# Altium schematic symbol library Analog Devices Data Converters Digital-to-Analog Converters.SchLib: 2231 symbols (part 108 of 135) (continued)
## AD8582AN
designator U?
Dual 12-Bit Digital-to-Analog Converter with Parallel Interface, 5 V, -40 to +85 degC, N-24-1, Tube; Generic Part Number: AD8582; Manufacturer: Analog Devices; PartNumber: AD8582AN; # DAC Outputs: 2; Max V+: 5.25V; Op Pwr Diss: 35mW; Resolution (Bits): 12; Settling Time: 16µs; Single Supply: Yes; DatasheetVersion: Rev.0; PackageVersion: 071006-A; PackageReference: N-24-1; PackageDescription: 24-Lead Plastic Dual In-Line Package [PDIP] Narrow Body; Supplier 1: Digi-Key; Supplier Part Number 1: AD8582AN-ND; Supplier 2: Mouser; Supplier Part Number 2: 584-AD8582AN; Packing: Tube; RoHS: N; Mounting Technology: Through Hole; Code_JEDEC: MS-001; ComponentLink1Description: Manufacturer URL; ComponentLink1URL: http://www.analog.com/en/index.html; ComponentLink2Description: Datasheet; ComponentLink2URL: http://www.analog.com/static/imported-files/data_sheets/AD8582.pdf; ComponentLink3Description: Package Specification; ComponentLink3URL: http://www.analog.com/static/imported-files/packages/50726455539629N_24_1.pdf; ComponentLink4Description: Product URL; ComponentLink4URL: http://www.analog.com/en/digital-to-analog-converters/da-converters/ad8582/products/product.html
footprint N-24-1 (DIP, 24-Leads, Row Spacing 7.62mm, Pitch 2.54mm, Body 31.9x6.6mm)
pins: 1 VOUTA (out) "Voltage outputs from the DACs. Fixed output voltage range of 0 V to 4.095 V with 1 mV/LSB. An internal temperature stabilized reference maintains a fixed full-scale voltage independent of time, temperature and power supply (See Datasheet)", 2 AGND (power) "Analog Ground. Ground reference for the internal bandgap reference voltage, the DAC, and the output buffer.", 3 DGND (power) "Digital ground for input logic.", 4 ~{LDA} (in) "Load DAC register strobes. Transfers input register data to the DAC registers. Active low inputs, Level sensitive latch. May be connected together to doublebuffer load DAC registers.", 5 MSB (in) "Digital Input: High presets DAC registers to half scale (800H), Low clears DAC registers to zero (000H) upon R\S\T\ assertion.", 6 ~{RST} (in) "Active low digital input that clears the DAC register to zero, setting the DAC to minimum scale when MSB pin = 0, or half-scale when MSB pin = 1.", 7 DB0 (in) "Binary Data Bit Input. DB0 is the LSB.", 8 DB1 (in) "Binary Data Bit Input.", 9 DB2 (in) "Binary Data Bit Input.", 10 DB3 (in) "Binary Data Bit Input.", 11 DB4 (in) "Binary Data Bit Input.", 12 DB5 (in) "Binary Data Bit Input.", 13 DB6 (in) "Binary Data Bit Input.", 14 DB7 (in) "Binary Data Bit Input.", 15 DB8 (in) "Binary Data Bit Input.", 16 DB9 (in) "Binary Data Bit Input.", 17 DB10 (in) "Binary Data Bit Input.", 18 DB11 (in) "Binary Data Bit Input.DB11 is the MSB .", 19 ~{CS} (in) "Chip Select. Active low input.", 20 ~{A}/B (in) "Select DAC A = 0 or DAC B = 1.", 21 ~{LDB} (in) "Load DAC register strobes. Transfers input register data to the DAC registers. Active low inputs, Level sensitive latch. May be connected together to doublebuffer load DAC registers.", 22 VDD (power) "Positive Supply. Nominal value +5 V, +/-5%.", 23 VREF (out) "Nominal 2.5 V reference output voltage. This node must be buffered if required to drive external loads.", 24 VOUTB (out) "Voltage outputs from the DACs. Fixed output voltage range of 0 V to 4.095 V with 1 mV/LSB. An internal temperature stabilized reference maintains a fixed full-scale voltage independent of time, temperature and power supply (See Datasheet)"

## AD8582ANZ
designator U?
Dual 12-Bit Digital-to-Analog Converter with Parallel Interface, 5 V, -40 to +85 degC, N-24-1, Pb-Free, Tube; Generic Part Number: AD8582; Manufacturer: Analog Devices; PartNumber: AD8582ANZ; # DAC Outputs: 2; Max V+: 5.25V; Op Pwr Diss: 35mW; Resolution (Bits): 12; Settling Time: 16µs; Single Supply: Yes; DatasheetVersion: Rev.0; PackageVersion: 071006-A; PackageReference: N-24-1; PackageDescription: 24-Lead Plastic Dual In-Line Package [PDIP] Narrow Body; Supplier 1: Digi-Key; Supplier Part Number 1: AD8582ANZ-ND; Supplier 2: Newark; Supplier Part Number 2: 12M9119; Supplier 3: Mouser; Supplier Part Number 3: 584-AD8582ANZ; Packing: Tube; RoHS: Y; Mounting Technology: Through Hole; Code_JEDEC: MS-001; ComponentLink1Description: Manufacturer URL; ComponentLink1URL: http://www.analog.com/en/index.html; ComponentLink2Description: Datasheet; ComponentLink2URL: http://www.analog.com/static/imported-files/data_sheets/AD8582.pdf; ComponentLink3Description: Package Specification; ComponentLink3URL: http://www.analog.com/static/imported-files/packages/50726455539629N_24_1.pdf; ComponentLink4Description: Product URL; ComponentLink4URL: http://www.analog.com/en/digital-to-analog-converters/da-converters/ad8582/products/product.html
footprint N-24-1 (DIP, 24-Leads, Row Spacing 7.62mm, Pitch 2.54mm, Body 31.9x6.6mm)
pins: 1 VOUTA (out) "Voltage outputs from the DACs. Fixed output voltage range of 0 V to 4.095 V with 1 mV/LSB. An internal temperature stabilized reference maintains a fixed full-scale voltage independent of time, temperature and power supply (See Datasheet)", 2 AGND (power) "Analog Ground. Ground reference for the internal bandgap reference voltage, the DAC, and the output buffer.", 3 DGND (power) "Digital ground for input logic.", 4 ~{LDA} (in) "Load DAC register strobes. Transfers input register data to the DAC registers. Active low inputs, Level sensitive latch. May be connected together to doublebuffer load DAC registers.", 5 MSB (in) "Digital Input: High presets DAC registers to half scale (800H), Low clears DAC registers to zero (000H) upon R\S\T\ assertion.", 6 ~{RST} (in) "Active low digital input that clears the DAC register to zero, setting the DAC to minimum scale when MSB pin = 0, or half-scale when MSB pin = 1.", 7 DB0 (in) "Binary Data Bit Input. DB0 is the LSB.", 8 DB1 (in) "Binary Data Bit Input.", 9 DB2 (in) "Binary Data Bit Input.", 10 DB3 (in) "Binary Data Bit Input.", 11 DB4 (in) "Binary Data Bit Input.", 12 DB5 (in) "Binary Data Bit Input.", 13 DB6 (in) "Binary Data Bit Input.", 14 DB7 (in) "Binary Data Bit Input.", 15 DB8 (in) "Binary Data Bit Input.", 16 DB9 (in) "Binary Data Bit Input.", 17 DB10 (in) "Binary Data Bit Input.", 18 DB11 (in) "Binary Data Bit Input.DB11 is the MSB .", 19 ~{CS} (in) "Chip Select. Active low input.", 20 ~{A}/B (in) "Select DAC A = 0 or DAC B = 1.", 21 ~{LDB} (in) "Load DAC register strobes. Transfers input register data to the DAC registers. Active low inputs, Level sensitive latch. May be connected together to doublebuffer load DAC registers.", 22 VDD (power) "Positive Supply. Nominal value +5 V, +/-5%.", 23 VREF (out) "Nominal 2.5 V reference output voltage. This node must be buffered if required to drive external loads.", 24 VOUTB (out) "Voltage outputs from the DACs. Fixed output voltage range of 0 V to 4.095 V with 1 mV/LSB. An internal temperature stabilized reference maintains a fixed full-scale voltage independent of time, temperature and power supply (See Datasheet)"

## AD8582AR
designator U?
Dual 12-Bit Digital-to-Analog Converter with Parallel Interface, 5 V, -40 to +85 degC, RW-24, Tube; Generic Part Number: AD8582; Manufacturer: Analog Devices; PartNumber: AD8582AR; # DAC Outputs: 2; Max V+: 5.25V; Op Pwr Diss: 35mW; Resolution (Bits): 12; Settling Time: 16µs; Single Supply: Yes; DatasheetVersion: Rev.0; PackageVersion: 060706-A; PackageReference: RW-24; PackageDescription: 24-Lead Standard Small Outline Package [SOIC_W]; Supplier 1: Digi-Key; Supplier Part Number 1: AD8582AR-ND; Supplier 2: Mouser; Supplier Part Number 2: 584-AD8582AR; Packing: Tube; RoHS: N; Mounting Technology: Surface Mount; Code_JEDEC: MS-013-AD; ComponentLink1Description: Manufacturer URL; ComponentLink1URL: http://www.analog.com/en/index.html; ComponentLink2Description: Datasheet; ComponentLink2URL: http://www.analog.com/static/imported-files/data_sheets/AD8582.pdf; ComponentLink3Description: Package Specification; ComponentLink3URL: http://www.analog.com/static/imported-files/packages/33665150946139RW_24.pdf; ComponentLink4Description: Product URL; ComponentLink4URL: http://www.analog.com/en/digital-to-analog-converters/da-converters/ad8582/products/product.html
footprint RW-24_N (SOIC, 24-Leads, Body 15.4x7.5mm, Pitch 1.27mm, IPC Medium Density)
footprint RW-24_L (SOIC, 24-Leads, Body 15.4x7.5mm, Pitch 1.27mm, IPC High Density)
footprint RW-24_M (SOIC, 24-Leads, Body 15.4x7.5mm, Pitch 1.27mm, IPC Low Density)
pins: 1 VOUTA (out) "Voltage outputs from the DACs. Fixed output voltage range of 0 V to 4.095 V with 1 mV/LSB. An internal temperature stabilized reference maintains a fixed full-scale voltage independent of time, temperature and power supply (See Datasheet)", 2 AGND (power) "Analog Ground. Ground reference for the internal bandgap reference voltage, the DAC, and the output buffer.", 3 DGND (power) "Digital ground for input logic.", 4 ~{LDA} (in) "Load DAC register strobes. Transfers input register data to the DAC registers. Active low inputs, Level sensitive latch. May be connected together to doublebuffer load DAC registers.", 5 MSB (in) "Digital Input: High presets DAC registers to half scale (800H), Low clears DAC registers to zero (000H) upon R\S\T\ assertion.", 6 ~{RST} (in) "Active low digital input that clears the DAC register to zero, setting the DAC to minimum scale when MSB pin = 0, or half-scale when MSB pin = 1.", 7 DB0 (in) "Twelve Binary Data Bit Input.  DB0 is the LSB.", 8 DB1 (in) "Twelve Binary Data Bit Input.", 9 DB2 (in) "Twelve Binary Data Bit Input.", 10 DB3 (in) "Twelve Binary Data Bit Input.", 11 DB4 (in) "Twelve Binary Data Bit Input.", 12 DB5 (in) "Twelve Binary Data Bit Input.", 13 DB6 (in) "Twelve Binary Data Bit Input.", 14 DB7 (in) "Twelve Binary Data Bit Input.", 15 DB8 (in) "Twelve Binary Data Bit Input.", 16 DB9 (in) "Twelve Binary Data Bit Input.", 17 DB10 (in) "Twelve Binary Data Bit Input.", 18 DB11 (in) "Twelve Binary Data Bit Input. DB11 is the MSB.", 19 ~{CS} (in) "Chip Select. Active low input.", 20 ~{A}/B (in) "Select DAC A = 0 or DAC B = 1.", 21 ~{LDB} (in) "Load DAC register strobes. Transfers input register data to the DAC registers. Active low inputs, Level sensitive latch. May be connected together to doublebuffer load DAC registers.", 22 VDD (power) "Positive Supply. Nominal value +5 V, +/-5%.", 23 VREF (out) "Nominal 2.5 V reference output voltage. This node must be buffered if required to drive external loads.", 24 VOUTB (out) "Voltage outputs from the DACs. Fixed output voltage range of 0 V to 4.095 V with 1 mV/LSB. An internal temperature stabilized reference maintains a fixed full-scale voltage independent of time, temperature and power supply (See Datasheet)"

## AD8582AR-REEL
designator U?
Dual 12-Bit Digital-to-Analog Converter with Parallel Interface, 5 V, -40 to +85 degC, RW-24, Reel; Generic Part Number: AD8582; Manufacturer: Analog Devices; PartNumber: AD8582AR-REEL; # DAC Outputs: 2; Max V+: 5.25V; Op Pwr Diss: 35mW; Resolution (Bits): 12; Settling Time: 16µs; Single Supply: Yes; DatasheetVersion: Rev.0; PackageVersion: 060706-A; PackageReference: RW-24; PackageDescription: 24-Lead Standard Small Outline Package [SOIC_W]; Supplier 1: Digi-Key; Supplier Part Number 1: AD8582AR-REEL-ND; Supplier 2: Newark; Supplier Part Number 2: 59K6879; Supplier 3: Mouser; Supplier Part Number 3: 584-AD8582AR-R; Packing: Reel; RoHS: N; Mounting Technology: Surface Mount; Code_JEDEC: MS-013-AD; ComponentLink1Description: Manufacturer URL; ComponentLink1URL: http://www.analog.com/en/index.html; ComponentLink2Description: Datasheet; ComponentLink2URL: http://www.analog.com/static/imported-files/data_sheets/AD8582.pdf; ComponentLink3Description: Package Specification; ComponentLink3URL: http://www.analog.com/static/imported-files/packages/33665150946139RW_24.pdf; ComponentLink4Description: Product URL; ComponentLink4URL: http://www.analog.com/en/digital-to-analog-converters/da-converters/ad8582/products/product.html
footprint RW-24_N (SOIC, 24-Leads, Body 15.4x7.5mm, Pitch 1.27mm, IPC Medium Density)
footprint RW-24_L (SOIC, 24-Leads, Body 15.4x7.5mm, Pitch 1.27mm, IPC High Density)
footprint RW-24_M (SOIC, 24-Leads, Body 15.4x7.5mm, Pitch 1.27mm, IPC Low Density)
pins: 1 VOUTA (out) "Voltage outputs from the DACs. Fixed output voltage range of 0 V to 4.095 V with 1 mV/LSB. An internal temperature stabilized reference maintains a fixed full-scale voltage independent of time, temperature and power supply (See Datasheet)", 2 AGND (power) "Analog Ground. Ground reference for the internal bandgap reference voltage, the DAC, and the output buffer.", 3 DGND (power) "Digital ground for input logic.", 4 ~{LDA} (in) "Load DAC register strobes. Transfers input register data to the DAC registers. Active low inputs, Level sensitive latch. May be connected together to doublebuffer load DAC registers.", 5 MSB (in) "Digital Input: High presets DAC registers to half scale (800H), Low clears DAC registers to zero (000H) upon R\S\T\ assertion.", 6 ~{RST} (in) "Active low digital input that clears the DAC register to zero, setting the DAC to minimum scale when MSB pin = 0, or half-scale when MSB pin = 1.", 7 DB0 (in) "Twelve Binary Data Bit Input.  DB0 is the LSB.", 8 DB1 (in) "Twelve Binary Data Bit Input.", 9 DB2 (in) "Twelve Binary Data Bit Input.", 10 DB3 (in) "Twelve Binary Data Bit Input.", 11 DB4 (in) "Twelve Binary Data Bit Input.", 12 DB5 (in) "Twelve Binary Data Bit Input.", 13 DB6 (in) "Twelve Binary Data Bit Input.", 14 DB7 (in) "Twelve Binary Data Bit Input.", 15 DB8 (in) "Twelve Binary Data Bit Input.", 16 DB9 (in) "Twelve Binary Data Bit Input.", 17 DB10 (in) "Twelve Binary Data Bit Input.", 18 DB11 (in) "Twelve Binary Data Bit Input. DB11 is the MSB.", 19 ~{CS} (in) "Chip Select. Active low input.", 20 ~{A}/B (in) "Select DAC A = 0 or DAC B = 1.", 21 ~{LDB} (in) "Load DAC register strobes. Transfers input register data to the DAC registers. Active low inputs, Level sensitive latch. May be connected together to doublebuffer load DAC registers.", 22 VDD (power) "Positive Supply. Nominal value +5 V, +/-5%.", 23 VREF (out) "Nominal 2.5 V reference output voltage. This node must be buffered if required to drive external loads.", 24 VOUTB (out) "Voltage outputs from the DACs. Fixed output voltage range of 0 V to 4.095 V with 1 mV/LSB. An internal temperature stabilized reference maintains a fixed full-scale voltage independent of time, temperature and power supply (See Datasheet)"

## AD8582ARZ
designator U?
Dual 12-Bit Digital-to-Analog Converter with Parallel Interface, 5 V, -40 to +85 degC, RW-24, Pb-Free, Tube; Generic Part Number: AD8582; Manufacturer: Analog Devices; PartNumber: AD8582ARZ; # DAC Outputs: 2; Max V+: 5.25V; Op Pwr Diss: 35mW; Resolution (Bits): 12; Settling Time: 16µs; Single Supply: Yes; DatasheetVersion: Rev.0; PackageVersion: 060706-A; PackageReference: RW-24; PackageDescription: 24-Lead Standard Small Outline Package [SOIC_W]; Supplier 1: Digi-Key; Supplier Part Number 1: AD8582ARZ-ND; Supplier 2: Newark; Supplier Part Number 2: 59K6880; Supplier 3: Mouser; Supplier Part Number 3: 584-AD8582ARZ; Packing: Tube; RoHS: Y; Mounting Technology: Surface Mount; Code_JEDEC: MS-013-AD; ComponentLink1Description: Manufacturer URL; ComponentLink1URL: http://www.analog.com/en/index.html; ComponentLink2Description: Datasheet; ComponentLink2URL: http://www.analog.com/static/imported-files/data_sheets/AD8582.pdf; ComponentLink3Description: Package Specification; ComponentLink3URL: http://www.analog.com/static/imported-files/packages/33665150946139RW_24.pdf; ComponentLink4Description: Product URL; ComponentLink4URL: http://www.analog.com/en/digital-to-analog-converters/da-converters/ad8582/products/product.html
footprint RW-24_N (SOIC, 24-Leads, Body 15.4x7.5mm, Pitch 1.27mm, IPC Medium Density)
footprint RW-24_L (SOIC, 24-Leads, Body 15.4x7.5mm, Pitch 1.27mm, IPC High Density)
footprint RW-24_M (SOIC, 24-Leads, Body 15.4x7.5mm, Pitch 1.27mm, IPC Low Density)
pins: 1 VOUTA (out) "Voltage outputs from the DACs. Fixed output voltage range of 0 V to 4.095 V with 1 mV/LSB. An internal temperature stabilized reference maintains a fixed full-scale voltage independent of time, temperature and power supply (See Datasheet)", 2 AGND (power) "Analog Ground. Ground reference for the internal bandgap reference voltage, the DAC, and the output buffer.", 3 DGND (power) "Digital ground for input logic.", 4 ~{LDA} (in) "Load DAC register strobes. Transfers input register data to the DAC registers. Active low inputs, Level sensitive latch. May be connected together to doublebuffer load DAC registers.", 5 MSB (in) "Digital Input: High presets DAC registers to half scale (800H), Low clears DAC registers to zero (000H) upon R\S\T\ assertion.", 6 ~{RST} (in) "Active low digital input that clears the DAC register to zero, setting the DAC to minimum scale when MSB pin = 0, or half-scale when MSB pin = 1.", 7 DB0 (in) "Twelve Binary Data Bit Input.  DB0 is the LSB.", 8 DB1 (in) "Twelve Binary Data Bit Input.", 9 DB2 (in) "Twelve Binary Data Bit Input.", 10 DB3 (in) "Twelve Binary Data Bit Input.", 11 DB4 (in) "Twelve Binary Data Bit Input.", 12 DB5 (in) "Twelve Binary Data Bit Input.", 13 DB6 (in) "Twelve Binary Data Bit Input.", 14 DB7 (in) "Twelve Binary Data Bit Input.", 15 DB8 (in) "Twelve Binary Data Bit Input.", 16 DB9 (in) "Twelve Binary Data Bit Input.", 17 DB10 (in) "Twelve Binary Data Bit Input.", 18 DB11 (in) "Twelve Binary Data Bit Input. DB11 is the MSB.", 19 ~{CS} (in) "Chip Select. Active low input.", 20 ~{A}/B (in) "Select DAC A = 0 or DAC B = 1.", 21 ~{LDB} (in) "Load DAC register strobes. Transfers input register data to the DAC registers. Active low inputs, Level sensitive latch. May be connected together to doublebuffer load DAC registers.", 22 VDD (power) "Positive Supply. Nominal value +5 V, +/-5%.", 23 VREF (out) "Nominal 2.5 V reference output voltage. This node must be buffered if required to drive external loads.", 24 VOUTB (out) "Voltage outputs from the DACs. Fixed output voltage range of 0 V to 4.095 V with 1 mV/LSB. An internal temperature stabilized reference maintains a fixed full-scale voltage independent of time, temperature and power supply (See Datasheet)"

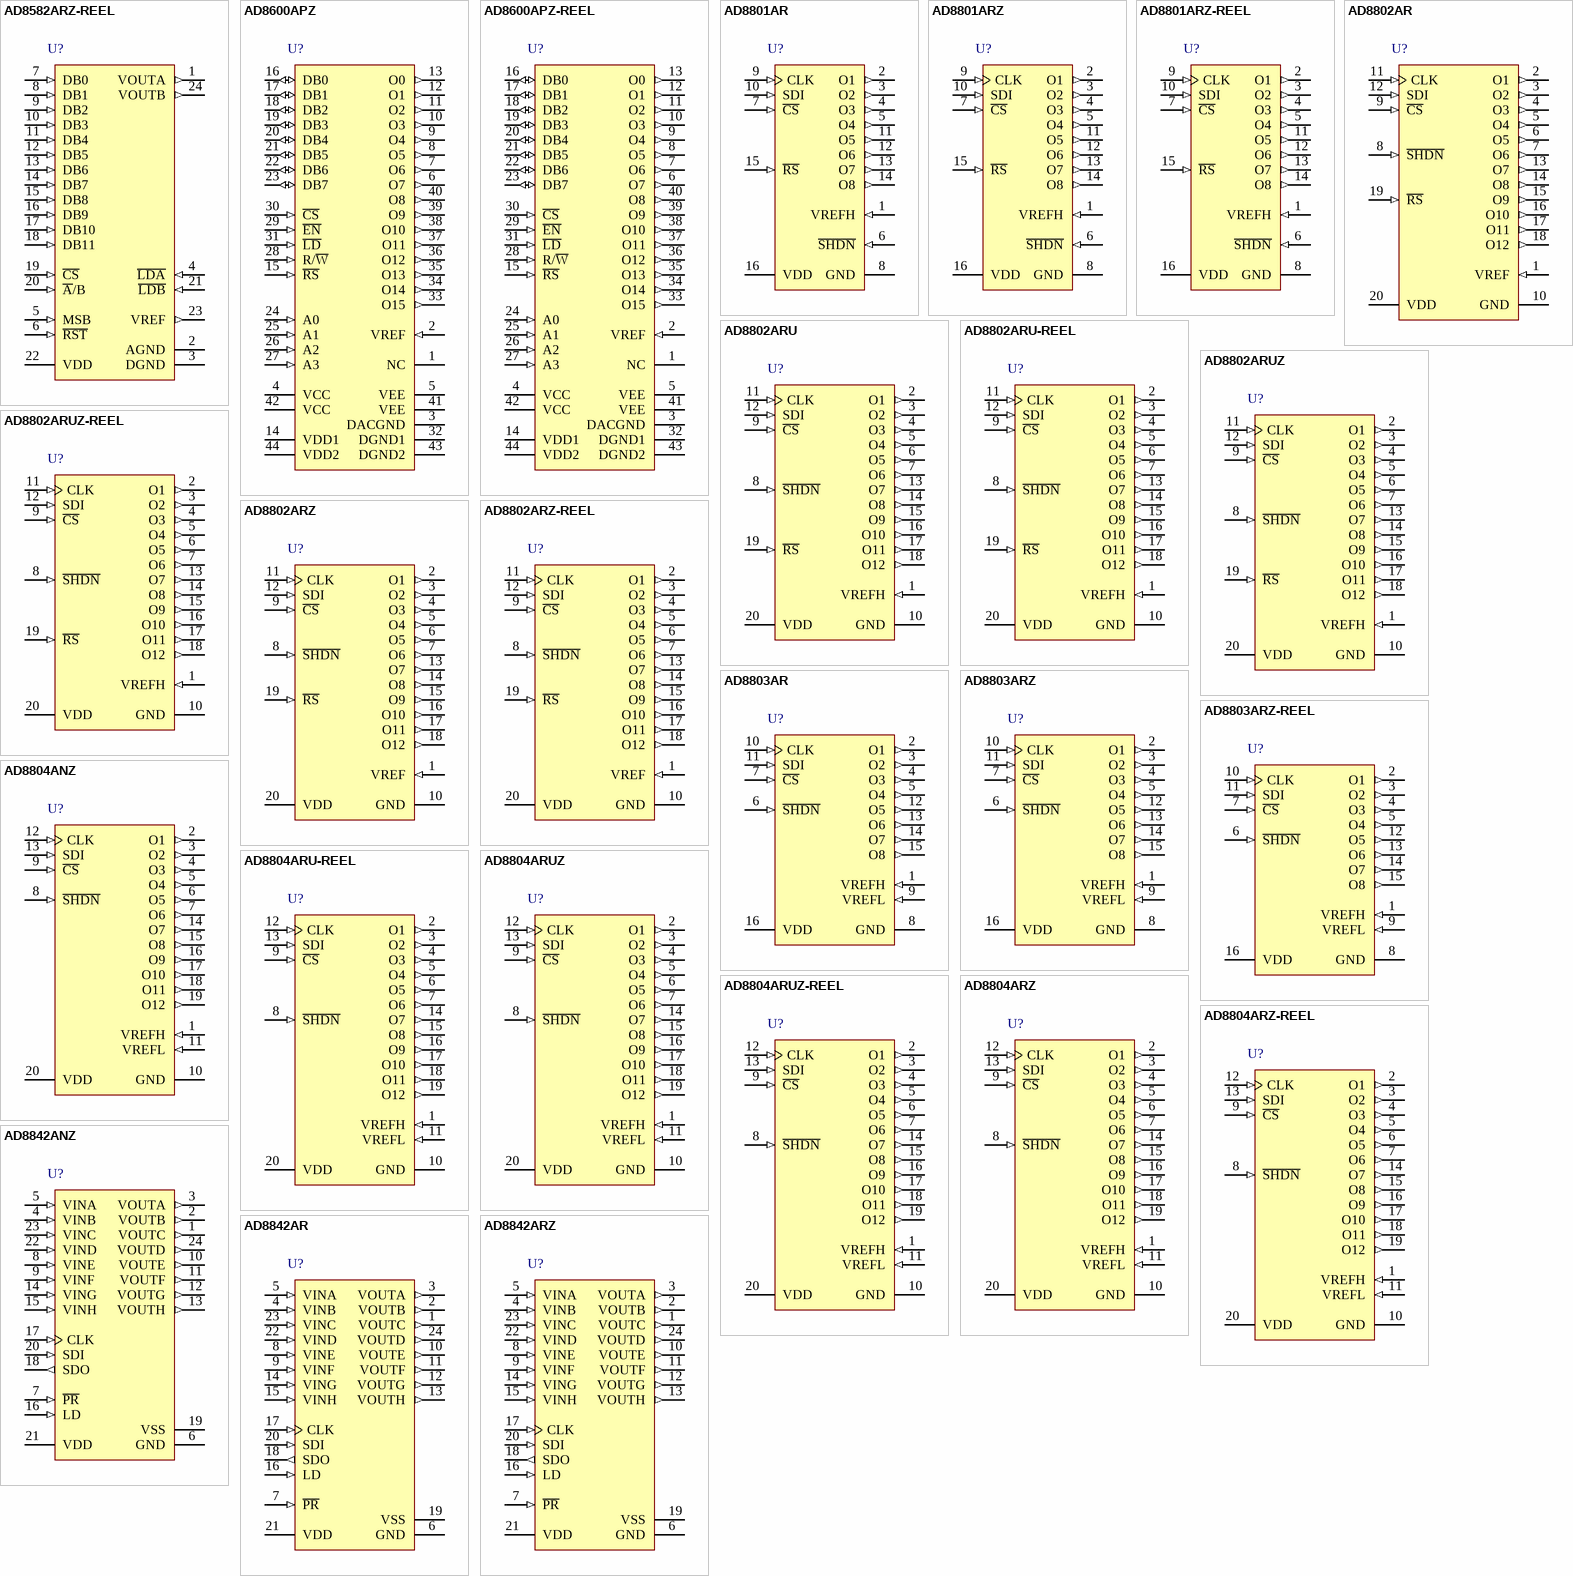
[diagram p82: symbols AD8582ARZ-REEL to AD8842ARZ]

## AD8582ARZ-REEL
designator U?
Dual 12-Bit Digital-to-Analog Converter with Parallel Interface, 5 V, -40 to +85 degC, RW-24, Pb-Free, Reel; Generic Part Number: AD8582; Manufacturer: Analog Devices; PartNumber: AD8582ARZ-REEL; # DAC Outputs: 2; Max V+: 5.25V; Op Pwr Diss: 35mW; Resolution (Bits): 12; Settling Time: 16µs; Single Supply: Yes; DatasheetVersion: Rev.0; PackageVersion: 060706-A; PackageReference: RW-24; PackageDescription: 24-Lead Standard Small Outline Package [SOIC_W]; Supplier 1: Digi-Key; Supplier Part Number 1: AD8582ARZ-REEL-ND; Supplier 2: Mouser; Supplier Part Number 2: 584-AD8582ARZ-R; Packing: Reel; RoHS: Y; Mounting Technology: Surface Mount; Code_JEDEC: MS-013-AD; ComponentLink1Description: Manufacturer URL; ComponentLink1URL: http://www.analog.com/en/index.html; ComponentLink2Description: Datasheet; ComponentLink2URL: http://www.analog.com/static/imported-files/data_sheets/AD8582.pdf; ComponentLink3Description: Package Specification; ComponentLink3URL: http://www.analog.com/static/imported-files/packages/33665150946139RW_24.pdf; ComponentLink4Description: Product URL; ComponentLink4URL: http://www.analog.com/en/digital-to-analog-converters/da-converters/ad8582/products/product.html
footprint RW-24_N (SOIC, 24-Leads, Body 15.4x7.5mm, Pitch 1.27mm, IPC Medium Density)
footprint RW-24_L (SOIC, 24-Leads, Body 15.4x7.5mm, Pitch 1.27mm, IPC High Density)
footprint RW-24_M (SOIC, 24-Leads, Body 15.4x7.5mm, Pitch 1.27mm, IPC Low Density)
pins: 1 VOUTA (out) "Voltage outputs from the DACs. Fixed output voltage range of 0 V to 4.095 V with 1 mV/LSB. An internal temperature stabilized reference maintains a fixed full-scale voltage independent of time, temperature and power supply (See Datasheet)", 2 AGND (power) "Analog Ground. Ground reference for the internal bandgap reference voltage, the DAC, and the output buffer.", 3 DGND (power) "Digital ground for input logic.", 4 ~{LDA} (in) "Load DAC register strobes. Transfers input register data to the DAC registers. Active low inputs, Level sensitive latch. May be connected together to doublebuffer load DAC registers.", 5 MSB (in) "Digital Input: High presets DAC registers to half scale (800H), Low clears DAC registers to zero (000H) upon R\S\T\ assertion.", 6 ~{RST} (in) "Active low digital input that clears the DAC register to zero, setting the DAC to minimum scale when MSB pin = 0, or half-scale when MSB pin = 1.", 7 DB0 (in) "Twelve Binary Data Bit Input.  DB0 is the LSB.", 8 DB1 (in) "Twelve Binary Data Bit Input.", 9 DB2 (in) "Twelve Binary Data Bit Input.", 10 DB3 (in) "Twelve Binary Data Bit Input.", 11 DB4 (in) "Twelve Binary Data Bit Input.", 12 DB5 (in) "Twelve Binary Data Bit Input.", 13 DB6 (in) "Twelve Binary Data Bit Input.", 14 DB7 (in) "Twelve Binary Data Bit Input.", 15 DB8 (in) "Twelve Binary Data Bit Input.", 16 DB9 (in) "Twelve Binary Data Bit Input.", 17 DB10 (in) "Twelve Binary Data Bit Input.", 18 DB11 (in) "Twelve Binary Data Bit Input. DB11 is the MSB.", 19 ~{CS} (in) "Chip Select. Active low input.", 20 ~{A}/B (in) "Select DAC A = 0 or DAC B = 1.", 21 ~{LDB} (in) "Load DAC register strobes. Transfers input register data to the DAC registers. Active low inputs, Level sensitive latch. May be connected together to doublebuffer load DAC registers.", 22 VDD (power) "Positive Supply. Nominal value +5 V, +/-5%.", 23 VREF (out) "Nominal 2.5 V reference output voltage. This node must be buffered if required to drive external loads.", 24 VOUTB (out) "Voltage outputs from the DACs. Fixed output voltage range of 0 V to 4.095 V with 1 mV/LSB. An internal temperature stabilized reference maintains a fixed full-scale voltage independent of time, temperature and power supply (See Datasheet)"

## AD8600APZ
designator U?
16 Channel 8-Bit Multiplying Digital-to-Analog Converter, -40 to +85 degC, P-44A, Pb-Free, Tube; Generic Part Number: AD8600; Manufacturer: Analog Devices; PartNumber: AD8600APZ; # DAC Outputs: 16; Max V+: 7V; Op Pwr Diss: 350mW; Resolution (Bits): 8; Settling Time: 1µs; Single Supply: Yes; DatasheetVersion: Rev.0; PackageVersion: 2003; PackageReference: P-44A; PackageDescription: 44-Lead Plastic Leaded Chip Carrier [PLCC]; Supplier 1: Digi-Key; Supplier Part Number 1: AD8600APZ-ND; Supplier 2: Newark; Supplier Part Number 2: 59K6886; Packing: Tube; RoHS: Y; Mounting Technology: Surface Mount; Code_JEDEC: MO-047-AC; Code_IPC: PLCC-44; ComponentLink1Description: Manufacturer URL; ComponentLink1URL: http://www.analog.com/en/index.html; ComponentLink2Description: Datasheet; ComponentLink2URL: http://www.analog.com/static/imported-files/data_sheets/AD8600.pdf; ComponentLink3Description: Package Specification; ComponentLink3URL: http://www.analog.com/static/imported-files/packages/533756178731793364534243243792136664964P44A.pdf; ComponentLink4Description: Product URL; ComponentLink4URL: http://www.analog.com/en/digital-to-analog-converters/da-converters/ad8600/products/product.html
footprint P-44A_N (Leaded Chip Carrier, 44-Leads, Body 16.6x16.6mm, Pitch 1.27mm, IPC Medium Density)
footprint P-44A_L (Leaded Chip Carrier, 44-Leads, Body 16.6x16.6mm, Pitch 1.27mm, IPC High Density)
footprint P-44A_M (Leaded Chip Carrier, 44-Leads, Body 16.6x16.6mm, Pitch 1.27mm, IPC Low Density)
pins: 1 NC "No Connection", 2 VREF (in) "Reference input voltage common to all DACs.", 3 DACGND (power) "DAC Analog Ground Return. Sets analog zero-scale voltage.", 4 VCC (power) "Output Amplifier Positive Supply", 5 VEE (power) "Output Amplifier Negative Supply", 6 O7 (out) "DAC Channel Output No. 7", 7 O6 (out) "DAC Channel Output No. 6", 8 O5 (out) "DAC Channel Output No. 5", 9 O4 (out) "DAC Channel Output No. 4", 10 O3 (out) "DAC Channel Output No. 3", 11 O2 (out) "DAC Channel Output No. 2", 12 O1 (out) "DAC Channel Output No. 1", 13 O0 (out) "DAC Channel Output No. 0", 14 VDD1 (power) "Digital Logic Power Supply", 15 ~{RS} (in) "Active Low Reset Input Pin", 16 DB0 (io) "Data Bit Zero I/O (LSB)", 17 DB1 (io) "Data Bit I/O", 18 DB2 (io) "Data Bit I/O", 19 DB3 (io) "Data Bit I/O", 20 DB4 (io) "Data Bit I/O", 21 DB5 (io) "Data Bit I/O", 22 DB6 (io) "Data Bit I/O", 23 DB7 (io) "Most Significant Data Bit I/O (MSB)", 24 A0 (in) "Address Bit Zero (LSB)", 25 A1 (in) "Address Bit", 26 A2 (in) "Address Bit", 27 A3 (in) "Most Significant Addr Bit (MSB)", 28 R/~{W} (in) "Read/Write Select Control Input", 29 ~{EN} (in) "Active Low Enable Clock Strobe", 30 ~{CS} (in) "Chip Select Input", 31 ~{LD} (in) "DAC Register Load Strobe", 32 DGND1 (power) "Digital Ground Input No. 1", 33 O15 (out) "DAC Channel Output No. 15", 34 O14 (out) "DAC Channel Output No. 14", 35 O13 (out) "DAC Channel Output No. 13", 36 O12 (out) "DAC Channel Output No. 12", 37 O11 (out) "DAC Channel Output No. 11", 38 O10 (out) "DAC Channel Output No. 10", 39 O9 (out) "DAC Channel Output No. 9", 40 O8 (out) "DAC Channel Output No. 8", 41 VEE (power) "Output Amplifier Negative Supply", 42 VCC (power) "Output Amplifier Positive Supply", 43 DGND2 (power) "Digital Ground Input No. 2", 44 VDD2 (power) "DAC Analog Supply Voltage"

## AD8600APZ-REEL
designator U?
16 Channel 8-Bit Multiplying Digital-to-Analog Converter, -40 to +85 degC, P-44A, Pb-Free, Reel; Generic Part Number: AD8600; Manufacturer: Analog Devices; PartNumber: AD8600APZ-REEL; # DAC Outputs: 16; Max V+: 7V; Op Pwr Diss: 350mW; Resolution (Bits): 8; Settling Time: 1µs; Single Supply: Yes; DatasheetVersion: Rev.0; PackageVersion: 2003; PackageReference: P-44A; PackageDescription: 44-Lead Plastic Leaded Chip Carrier [PLCC]; Supplier 1: Digi-Key; Supplier Part Number 1: AD8600APZ-REEL-ND; Packing: Reel; RoHS: Y; Mounting Technology: Surface Mount; Code_JEDEC: MO-047-AC; Code_IPC: PLCC-44; ComponentLink1Description: Manufacturer URL; ComponentLink1URL: http://www.analog.com/en/index.html; ComponentLink2Description: Datasheet; ComponentLink2URL: http://www.analog.com/static/imported-files/data_sheets/AD8600.pdf; ComponentLink3Description: Package Specification; ComponentLink3URL: http://www.analog.com/static/imported-files/packages/533756178731793364534243243792136664964P44A.pdf; ComponentLink4Description: Product URL; ComponentLink4URL: http://www.analog.com/en/digital-to-analog-converters/da-converters/ad8600/products/product.html
footprint P-44A_N (Leaded Chip Carrier, 44-Leads, Body 16.6x16.6mm, Pitch 1.27mm, IPC Medium Density)
footprint P-44A_L (Leaded Chip Carrier, 44-Leads, Body 16.6x16.6mm, Pitch 1.27mm, IPC High Density)
footprint P-44A_M (Leaded Chip Carrier, 44-Leads, Body 16.6x16.6mm, Pitch 1.27mm, IPC Low Density)
pins: 1 NC "No Connection", 2 VREF (in) "Reference input voltage common to all DACs.", 3 DACGND (power) "DAC Analog Ground Return. Sets analog zero-scale voltage.", 4 VCC (power) "Output Amplifier Positive Supply", 5 VEE (power) "Output Amplifier Negative Supply", 6 O7 (out) "DAC Channel Output No. 7", 7 O6 (out) "DAC Channel Output No. 6", 8 O5 (out) "DAC Channel Output No. 5", 9 O4 (out) "DAC Channel Output No. 4", 10 O3 (out) "DAC Channel Output No. 3", 11 O2 (out) "DAC Channel Output No. 2", 12 O1 (out) "DAC Channel Output No. 1", 13 O0 (out) "DAC Channel Output No. 0", 14 VDD1 (power) "Digital Logic Power Supply", 15 ~{RS} (in) "Active Low Reset Input Pin", 16 DB0 (io) "Data Bit Zero I/O (LSB)", 17 DB1 (io) "Data Bit I/O", 18 DB2 (io) "Data Bit I/O", 19 DB3 (io) "Data Bit I/O", 20 DB4 (io) "Data Bit I/O", 21 DB5 (io) "Data Bit I/O", 22 DB6 (io) "Data Bit I/O", 23 DB7 (io) "Most Significant Data Bit I/O (MSB)", 24 A0 (in) "Address Bit Zero (LSB)", 25 A1 (in) "Address Bit", 26 A2 (in) "Address Bit", 27 A3 (in) "Most Significant Addr Bit (MSB)", 28 R/~{W} (in) "Read/Write Select Control Input", 29 ~{EN} (in) "Active Low Enable Clock Strobe", 30 ~{CS} (in) "Chip Select Input", 31 ~{LD} (in) "DAC Register Load Strobe", 32 DGND1 (power) "Digital Ground Input No. 1", 33 O15 (out) "DAC Channel Output No. 15", 34 O14 (out) "DAC Channel Output No. 14", 35 O13 (out) "DAC Channel Output No. 13", 36 O12 (out) "DAC Channel Output No. 12", 37 O11 (out) "DAC Channel Output No. 11", 38 O10 (out) "DAC Channel Output No. 10", 39 O9 (out) "DAC Channel Output No. 9", 40 O8 (out) "DAC Channel Output No. 8", 41 VEE (power) "Output Amplifier Negative Supply", 42 VCC (power) "Output Amplifier Positive Supply", 43 DGND2 (power) "Digital Ground Input No. 2", 44 VDD2 (power) "DAC Analog Supply Voltage"

## AD8801AR
designator U?
Octal 8-Bit MDAC with Power Shutdown, -40 to +85 degC, R-16, Tube; Generic Part Number: AD8801; Manufacturer: Analog Devices; PartNumber: AD8801AR; # DAC Outputs: 8; Max V+: 5.5V; Op Pwr Diss: 20mW; Settling Time: 600ns; Single Supply: Yes; DatasheetVersion: Rev.A; PackageVersion: 060606-A; PackageReference: R-16; PackageDescription: 16-Lead Standard Small Outline Package [SOIC_N] Narrow Body; Supplier 1: Digi-Key; Supplier Part Number 1: AD8801AR-ND; Supplier 2: Mouser; Supplier Part Number 2: 584-AD8801AR; Packing: Tube; Resolution (Bits): 8; RoHS: N; Mounting Technology: Surface Mount; Code_JEDEC: MS-012-AC; ComponentLink1Description: Manufacturer URL; ComponentLink1URL: http://www.analog.com/en/index.html; ComponentLink2Description: Datasheet; ComponentLink2URL: http://www.analog.com/static/imported-files/data_sheets/AD8801_8803.pdf; ComponentLink3Description: Package Specification; ComponentLink3URL: http://www.analog.com/static/imported-files/packages/PKG_PDF/SOIC_Narrow%20(R)/R_16.pdf; ComponentLink4Description: Product URL; ComponentLink4URL: http://www.analog.com/en/digital-to-analog-converters/da-converters/ad8801/products/product.html
footprint R-16_N (SOIC, 16-Leads, Body 9.9x3.9mm, Pitch 1.27mm, IPC Medium Density)
footprint R-16_L (SOIC, 16-Leads, Body 9.9x3.9mm, Pitch 1.27mm, IPC High Density)
footprint R-16_M (SOIC, 16-Leads, Body 9.9x3.9mm, Pitch 1.27mm, IPC Low Density)
pins: 1 VREFH (in) "Common DAC Reference Input", 2 O1 (out) "DAC Output #1, Addr = 000", 3 O2 (out) "DAC Output #2, Addr = 001", 4 O3 (out) "DAC Output #3, Addr = 010", 5 O4 (out) "DAC Output #4, Addr = 011", 6 ~{SHDN} (in) "Reference input open circuit, active low, all DAC outputs open circuit. DAC latch settings maintained.", 7 ~{CS} (in) "Chip Select Input, active low. When C\S\ returns high, data in the serial input register is decoded based on the address bits and loaded into the target DAC register.", 8 GND (power) "Ground", 9 CLK (in) "Serial Clock Input, Positive Edge Triggered", 10 SDI (in) "Serial Data Input", 11 O5 (out) "DAC Output #5, Addr = 100", 12 O6 (out) "DAC Output #6, Addr = 101", 13 O7 (out) "DAC Output #7, Addr = 110", 14 O8 (out) "DAC Output #8, Addr = 111", 15 ~{RS} (in) "Asynchronous preset to midscale output setting,active low. Loads all DAC latches with 80H.", 16 VDD (power) "Positive power supply, specified for operation at both +3 V and +5 V."

## AD8801ARZ
designator U?
Octal 8-Bit MDAC with Power Shutdown, -40 to +85 degC, R-16, Pb-Free, Tube; Generic Part Number: AD8801; Manufacturer: Analog Devices; PartNumber: AD8801ARZ; # DAC Outputs: 8; Max V+: 5.5V; Op Pwr Diss: 20mW; Settling Time: 600ns; Single Supply: Yes; DatasheetVersion: Rev.A; PackageVersion: 060606-A; PackageReference: R-16; PackageDescription: 16-Lead Standard Small Outline Package [SOIC_N] Narrow Body; Supplier 1: Digi-Key; Supplier Part Number 1: AD8801ARZ-ND; Supplier 2: Farnell; Supplier Part Number 2: 1311358; Supplier 3: Newark; Supplier Part Number 3: 59K7101; Supplier 4: Mouser; Supplier Part Number 4: 584-AD8801ARZ; Packing: Tube; Resolution (Bits): 8; RoHS: Y; Mounting Technology: Surface Mount; Code_JEDEC: MS-012-AC; ComponentLink1Description: Manufacturer URL; ComponentLink1URL: http://www.analog.com/en/index.html; ComponentLink2Description: Datasheet; ComponentLink2URL: http://www.analog.com/static/imported-files/data_sheets/AD8801_8803.pdf; ComponentLink3Description: Package Specification; ComponentLink3URL: http://www.analog.com/static/imported-files/packages/PKG_PDF/SOIC_Narrow%20(R)/R_16.pdf; ComponentLink4Description: Product URL; ComponentLink4URL: http://www.analog.com/en/digital-to-analog-converters/da-converters/ad8801/products/product.html
footprint R-16_N (SOIC, 16-Leads, Body 9.9x3.9mm, Pitch 1.27mm, IPC Medium Density)
footprint R-16_L (SOIC, 16-Leads, Body 9.9x3.9mm, Pitch 1.27mm, IPC High Density)
footprint R-16_M (SOIC, 16-Leads, Body 9.9x3.9mm, Pitch 1.27mm, IPC Low Density)
pins: 1 VREFH (in) "Common DAC Reference Input", 2 O1 (out) "DAC Output #1, Addr = 000", 3 O2 (out) "DAC Output #2, Addr = 001", 4 O3 (out) "DAC Output #3, Addr = 010", 5 O4 (out) "DAC Output #4, Addr = 011", 6 ~{SHDN} (in) "Reference input open circuit, active low, all DAC outputs open circuit. DAC latch settings maintained.", 7 ~{CS} (in) "Chip Select Input, active low. When C\S\ returns high, data in the serial input register is decoded based on the address bits and loaded into the target DAC register.", 8 GND (power) "Ground", 9 CLK (in) "Serial Clock Input, Positive Edge Triggered", 10 SDI (in) "Serial Data Input", 11 O5 (out) "DAC Output #5, Addr = 100", 12 O6 (out) "DAC Output #6, Addr = 101", 13 O7 (out) "DAC Output #7, Addr = 110", 14 O8 (out) "DAC Output #8, Addr = 111", 15 ~{RS} (in) "Asynchronous preset to midscale output setting,active low. Loads all DAC latches with 80H.", 16 VDD (power) "Positive power supply, specified for operation at both +3 V and +5 V."

## AD8801ARZ-REEL
designator U?
Octal 8-Bit MDAC with Power Shutdown, -40 to +85 degC, R-16, Pb-Free, Reel; Generic Part Number: AD8801; Manufacturer: Analog Devices; PartNumber: AD8801ARZ-REEL; # DAC Outputs: 8; Max V+: 5.5V; Op Pwr Diss: 20mW; Settling Time: 600ns; Single Supply: Yes; DatasheetVersion: Rev.A; PackageVersion: 060606-A; PackageReference: R-16; PackageDescription: 16-Lead Standard Small Outline Package [SOIC_N] Narrow Body; Supplier 1: Digi-Key; Supplier Part Number 1: AD8801ARZ-REEL-ND; Supplier 2: Newark; Supplier Part Number 2: 59K7102; Supplier 3: Mouser; Supplier Part Number 3: 584-AD8801ARZ-R; Packing: Reel; Resolution (Bits): 8; RoHS: Y; Mounting Technology: Surface Mount; Code_JEDEC: MS-012-AC; ComponentLink1Description: Manufacturer URL; ComponentLink1URL: http://www.analog.com/en/index.html; ComponentLink2Description: Datasheet; ComponentLink2URL: http://www.analog.com/static/imported-files/data_sheets/AD8801_8803.pdf; ComponentLink3Description: Package Specification; ComponentLink3URL: http://www.analog.com/static/imported-files/packages/PKG_PDF/SOIC_Narrow%20(R)/R_16.pdf; ComponentLink4Description: Product URL; ComponentLink4URL: http://www.analog.com/en/digital-to-analog-converters/da-converters/ad8801/products/product.html
footprint R-16_N (SOIC, 16-Leads, Body 9.9x3.9mm, Pitch 1.27mm, IPC Medium Density)
footprint R-16_L (SOIC, 16-Leads, Body 9.9x3.9mm, Pitch 1.27mm, IPC High Density)
footprint R-16_M (SOIC, 16-Leads, Body 9.9x3.9mm, Pitch 1.27mm, IPC Low Density)
pins: 1 VREFH (in) "Common DAC Reference Input", 2 O1 (out) "DAC Output #1, Addr = 000", 3 O2 (out) "DAC Output #2, Addr = 001", 4 O3 (out) "DAC Output #3, Addr = 010", 5 O4 (out) "DAC Output #4, Addr = 011", 6 ~{SHDN} (in) "Reference input open circuit, active low, all DAC outputs open circuit. DAC latch settings maintained.", 7 ~{CS} (in) "Chip Select Input, active low. When C\S\ returns high, data in the serial input register is decoded based on the address bits and loaded into the target DAC register.", 8 GND (power) "Ground", 9 CLK (in) "Serial Clock Input, Positive Edge Triggered", 10 SDI (in) "Serial Data Input", 11 O5 (out) "DAC Output #5, Addr = 100", 12 O6 (out) "DAC Output #6, Addr = 101", 13 O7 (out) "DAC Output #7, Addr = 110", 14 O8 (out) "DAC Output #8, Addr = 111", 15 ~{RS} (in) "Asynchronous preset to midscale output setting,active low. Loads all DAC latches with 80H.", 16 VDD (power) "Positive power supply, specified for operation at both +3 V and +5 V."